# Altium footprint library UWRT Footprint Library.PcbLib: 258 footprints (part 15 of 17)
Each footprint in its own frame and in the unit in brackets; x right, y up, seen from the top. Pads: shape width x height; smd on the part's side, far side on the other; paste and mask are expansions set on the pad; w line width, h text height; cw(c..) or ccw(c..) is an arc to the next point about the centre after c.
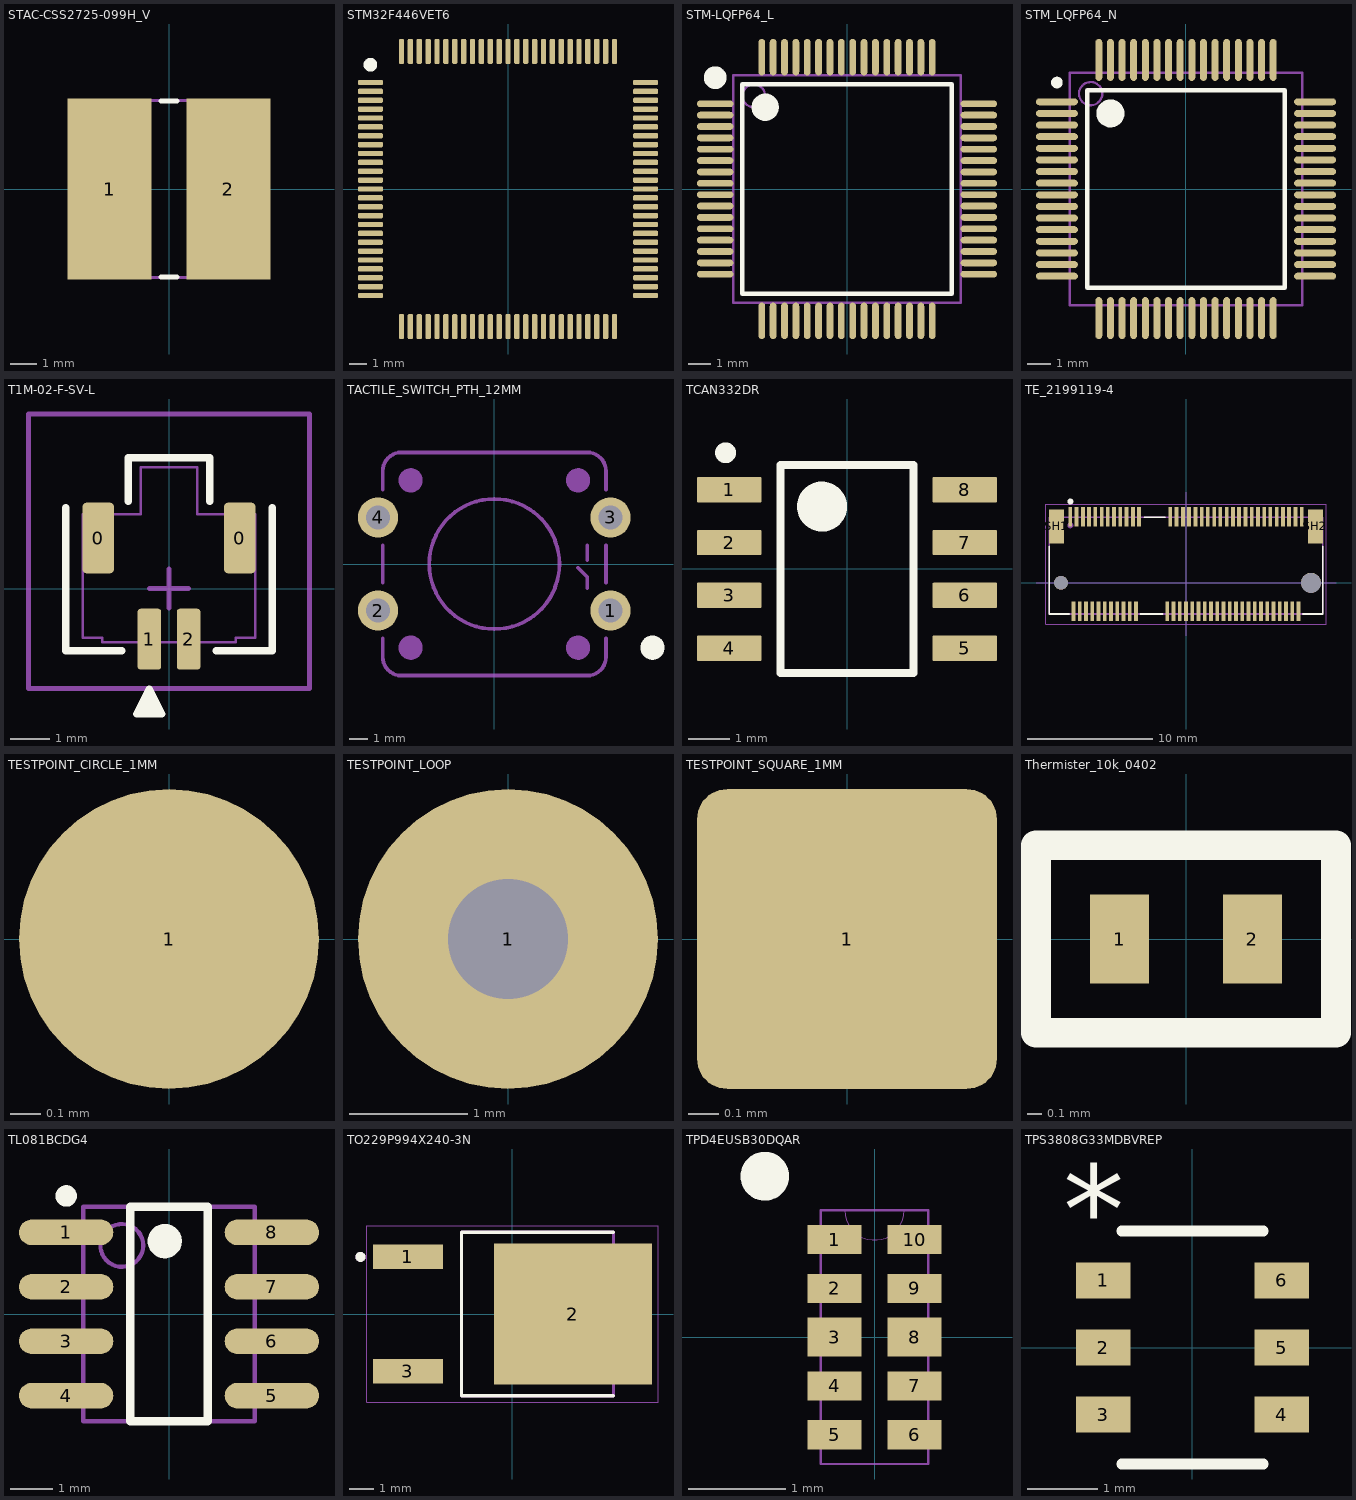
[diagram p14: the footprints below, top view; thin cyan lines are the x and y axes]

## STAC-CSS2725-099H_V [mm] "Chip Resistor, 2-Leads, Body 7.06x6.7mm"
height 1.24
pads (2):
  rect 3.18x6.86 smd: 1(-2.25,0) 2(2.25,0)
Top Overlay:
  lines w0.2: -0.3,-3.33 0.3,-3.33 ; -0.3,3.33 0.3,3.33
Mechanical 13:
  lines w0.1: -3.53,-3.35 3.53,-3.35 3.53,3.35 -3.53,3.35 -3.53,-3.35
3D body "RESC6865X12L.step": height 1.24, standoff 0, extent -3.53,-3.35 3.53,3.35

## STM32F446VET6 [mm] "LQFP100"
pads (100):
  rrect50% 1.4x0.3 smd mask+0.051: 1(-7.75,6) 2(-7.75,5.5) 3(-7.75,5) 4(-7.75,4.5) 5(-7.75,4) 6(-7.75,3.5) 7(-7.75,3) 8(-7.75,2.5) 9(-7.75,2) 10(-7.75,1.5) 11(-7.75,1) 12(-7.75,0.5) 13(-7.75,0) 14(-7.75,-0.5) 15(-7.75,-1) 16(-7.75,-1.5) 17(-7.75,-2) 18(-7.75,-2.5) 19(-7.75,-3) 20(-7.75,-3.5) 21(-7.75,-4) 22(-7.75,-4.5) 23(-7.75,-5) 24(-7.75,-5.5) 25(-7.75,-6) 51(7.75,-6) 52(7.75,-5.5) 53(7.75,-5) 54(7.75,-4.5) 55(7.75,-4) 56(7.75,-3.5) 57(7.75,-3) 58(7.75,-2.5) 59(7.75,-2) 60(7.75,-1.5) 61(7.75,-1) 62(7.75,-0.5) 63(7.75,0) 64(7.75,0.5) 65(7.75,1) 66(7.75,1.5) 67(7.75,2) 68(7.75,2.5) 69(7.75,3) 70(7.75,3.5) 71(7.75,4) 72(7.75,4.5) 73(7.75,5) 74(7.75,5.5) 75(7.75,6)
  rrect50% 0.3x1.4 smd mask+0.051: 26(-6,-7.75) 27(-5.5,-7.75) 28(-5,-7.75) 29(-4.5,-7.75) 30(-4,-7.75) 31(-3.5,-7.75) 32(-3,-7.75) 33(-2.5,-7.75) 34(-2,-7.75) 35(-1.5,-7.75) 36(-1,-7.75) 37(-0.5,-7.75) 38(0,-7.75) 39(0.5,-7.75) 40(1,-7.75) 41(1.5,-7.75) 42(2,-7.75) 43(2.5,-7.75) 44(3,-7.75) 45(3.5,-7.75) 46(4,-7.75) 47(4.5,-7.75) 48(5,-7.75) 49(5.5,-7.75) 50(6,-7.75) 76(6,7.75) 77(5.5,7.75) 78(5,7.75) 79(4.5,7.75) 80(4,7.75) 81(3.5,7.75) 82(3,7.75) 83(2.5,7.75) 84(2,7.75) 85(1.5,7.75) 86(1,7.75) 87(0.5,7.75) 88(0,7.75) 89(-0.5,7.75) 90(-1,7.75) 91(-1.5,7.75) 92(-2,7.75) 93(-2.5,7.75) 94(-3,7.75) 95(-3.5,7.75) 96(-4,7.75) 97(-4.5,7.75) 98(-5,7.75) 99(-5.5,7.75) 100(-6,7.75)
Top Overlay:
  circle w0.508: c-7.75,7 r0.127
3D body "User Library-LQFP100.STEP": height 1.6, standoff 0, extent -8,-8 8,8

## STM-LQFP64_L [mm] "QFP, 64-Leads, Body 10x10mm, Pitch 0.5mm, IPC High Density"
height 1.6
pads (64):
  oval 1.6x0.3 smd: 1(-5.8,3.75) 2(-5.8,3.25) 3(-5.8,2.75) 4(-5.8,2.25) 5(-5.8,1.75) 6(-5.8,1.25) 7(-5.8,0.75) 8(-5.8,0.25) 9(-5.8,-0.25) 10(-5.8,-0.75) 11(-5.8,-1.25) 12(-5.8,-1.75) 13(-5.8,-2.25) 14(-5.8,-2.75) 15(-5.8,-3.25) 16(-5.8,-3.75) 33(5.8,-3.75) 34(5.8,-3.25) 35(5.8,-2.75) 36(5.8,-2.25) 37(5.8,-1.75) 38(5.8,-1.25) 39(5.8,-0.75) 40(5.8,-0.25) 41(5.8,0.25) 42(5.8,0.75) 43(5.8,1.25) 44(5.8,1.75) 45(5.8,2.25) 46(5.8,2.75) 47(5.8,3.25) 48(5.8,3.75)
  oval 0.3x1.6 smd: 17(-3.75,-5.8) 18(-3.25,-5.8) 19(-2.75,-5.8) 20(-2.25,-5.8) 21(-1.75,-5.8) 22(-1.25,-5.8) 23(-0.75,-5.8) 24(-0.25,-5.8) 25(0.25,-5.8) 26(0.75,-5.8) 27(1.25,-5.8) 28(1.75,-5.8) 29(2.25,-5.8) 30(2.75,-5.8) 31(3.25,-5.8) 32(3.75,-5.8) 49(3.75,5.8) 50(3.25,5.8) 51(2.75,5.8) 52(2.25,5.8) 53(1.75,5.8) 54(1.25,5.8) 55(0.75,5.8) 56(0.25,5.8) 57(-0.25,5.8) 58(-0.75,5.8) 59(-1.25,5.8) 60(-1.75,5.8) 61(-2.25,5.8) 62(-2.75,5.8) 63(-3.25,5.8) 64(-3.75,5.8)
Top Overlay:
  circle w0.6: c-3.6,3.6 r0.3
  circle w0.75: c-5.8,4.9 r0.125
  lines w0.2: -4.6,-4.6 4.6,-4.6 4.6,4.6 -4.6,4.6 -4.6,-4.6
Mechanical 13:
  circle w0.1: c-4.1,4.1 r0.5
  lines w0.1: -5,-5 5,-5 5,5 -5,5 -5,-5
3D body "LQFP64.step": height 1.56, standoff 0, extent -5.979,-6 6.021,6

## STM_LQFP64_N [mm] "Thin QFP, 64-Leads, Body 10x10mm, Pitch 0.5mm, IPC Medium Density"
height 1.6
pads (64):
  oval 1.8x0.3 smd mask+0.05: 1(-5.55,3.75) 2(-5.55,3.25) 3(-5.55,2.75) 4(-5.55,2.25) 5(-5.55,1.75) 6(-5.55,1.25) 7(-5.55,0.75) 8(-5.55,0.25) 9(-5.55,-0.25) 10(-5.55,-0.75) 11(-5.55,-1.25) 12(-5.55,-1.75) 13(-5.55,-2.25) 14(-5.55,-2.75) 15(-5.55,-3.25) 16(-5.55,-3.75) 33(5.55,-3.75) 34(5.55,-3.25) 35(5.55,-2.75) 36(5.55,-2.25) 37(5.55,-1.75) 38(5.55,-1.25) 39(5.55,-0.75) 40(5.55,-0.25) 41(5.55,0.25) 42(5.55,0.75) 43(5.55,1.25) 44(5.55,1.75) 45(5.55,2.25) 46(5.55,2.75) 47(5.55,3.25) 48(5.55,3.75)
  oval 0.3x1.8 smd mask+0.05: 17(-3.75,-5.55) 18(-3.25,-5.55) 19(-2.75,-5.55) 20(-2.25,-5.55) 21(-1.75,-5.55) 22(-1.25,-5.55) 23(-0.75,-5.55) 24(-0.25,-5.55) 25(0.25,-5.55) 26(0.75,-5.55) 27(1.25,-5.55) 28(1.75,-5.55) 29(2.25,-5.55) 30(2.75,-5.55) 31(3.25,-5.55) 32(3.75,-5.55) 49(3.75,5.55) 50(3.25,5.55) 51(2.75,5.55) 52(2.25,5.55) 53(1.75,5.55) 54(1.25,5.55) 55(0.75,5.55) 56(0.25,5.55) 57(-0.25,5.55) 58(-0.75,5.55) 59(-1.25,5.55) 60(-1.75,5.55) 61(-2.25,5.55) 62(-2.75,5.55) 63(-3.25,5.55) 64(-3.75,5.55)
Top Overlay:
  circle w0.6: c-3.25,3.25 r0.3
  circle w0.25: c-5.55,4.577 r0.125
  lines w0.2: -4.25,-4.25 4.25,-4.25 4.25,4.25 -4.25,4.25 -4.25,-4.25
Mechanical 13:
  circle w0.1: c-4.1,4.1 r0.5
  lines w0.1: -5,-5 5,-5 5,5 -5,5 -5,-5
3D body "LQFP64.step": height 1.56, standoff 0, extent -6,-5.99 6,6.01

## T1M-02-F-SV-L [mm]
pads (4):
  rrect25% 0.8x1.8 smd: 0(-1.8,1.288) 0(1.8,1.288)
  rrect25% 0.6x1.55 smd: 1(-0.5,-1.287) 2(0.5,-1.287)
Top Overlay:
  region: -0.5,-2.557 -0.818,-3.192 -0.183,-3.192
  lines w0.191: -2.628,2.064 -2.628,-1.587 -1.199,-1.587 ; -1.04,2.222 -1.04,3.334 1.04,3.334 1.04,2.222 ; 1.199,-1.587 2.627,-1.587 2.627,2.064 ; -0.818,-3.192 -0.183,-3.192 -0.5,-2.557 -0.818,-3.192
Mechanical 1:
  lines w0.064: -2.2,-1.252 -1.7,-1.252 -1.7,-1.362 1.7,-1.362 1.7,-1.252 2.2,-1.252 2.2,1.887 0.722,1.887 0.722,3.088 -0.723,3.088 -0.723,1.887 -2.2,1.887 -2.2,-1.252
Mechanical 15:
  lines w0.127: -0.5,0 0.5,0 ; 0,-0.5 0,0.5 ; -3.58,-2.54 -3.58,4.445 3.58,4.445 3.58,-2.54 -3.58,-2.54
3D body "T1M-02-F-SV-L.stp": height 5.51, standoff 0.01, extent -2.2,-1.862 2.2,3.088

## TACTILE_SWITCH_PTH_12MM [mil]
pads (4):
  round 85 / inner round 60 / far side round 85 hole 51.18: 1(246.06,-98.43) 2(-246.06,-98.43) 3(246.06,98.43) 4(-246.06,98.43)
Top Overlay:
  circle w27.56: c334.65,-177.17 r11.81
Mechanical 3:
  lines w8: 177.17,-7.87 196.85,-27.56 196.85,-51.18 ; 196.85,7.87 196.85,39.37
Mechanical 7:
  circle w8: c0,0 r137.8
  circle w27.56: c-177.17,177.17 r11.81
  circle w27.56: c177.17,177.17 r11.81
  circle w27.56: c177.17,-177.17 r11.81
  circle w27.56: c-177.17,-177.17 r11.81
  lines w8: -236.22,-157.48 -236.22,-196.85 ccw(c-196.85,-196.85) -196.85,-236.22 196.85,-236.22 ccw(c196.85,-196.85) 236.22,-196.85 236.22,-157.48 ; -236.22,-39.37 -236.22,39.37 ; -236.22,157.48 -236.22,196.85 cw(c-196.85,196.85) -196.85,236.22 196.85,236.22 cw(c196.85,196.85) 236.22,196.85 236.22,157.48 ; 236.22,-39.37 236.22,39.37
3D body "User Library-SWT9.step": height 374.02, standoff -137.8, extent -274.07,-235.23 272.11,237.21

## TCAN332DR [mil] "SOIC, 8 Leads, Body 5x4mm, Pitch 1.27mm"
height 68.9
pads (8):
  rrect8% 61x24 smd: 1(-111.5,75) 2(-111.5,25) 3(-111.5,-25) 4(-111.5,-75) 5(111.5,-75) 6(111.5,-25) 7(111.5,25) 8(111.5,75)
Top Overlay:
  circle w23.62: c-23.62,59.06 r11.81
  circle w9.84: c-115,110 r4.92
  lines w7.87: -62.99,-98.43 62.99,-98.43 62.99,98.43 -62.99,98.43 -62.99,-98.43
3D body "TCAN332DR.stp": height 68.9, standoff 0, extent -118.1,-96.45 118.12,96.46

## TE_2199119-4 [mm]
pads (71):
  rect 0.3x1.55 smd: 1(-9.25,5.275) 2(-9,-2.275) 3(-8.75,5.275) 4(-8.5,-2.275) 5(-8.25,5.275) 6(-8,-2.275) 7(-7.75,5.275) 8(-7.5,-2.275) 9(-7.25,5.275) 10(-7,-2.275) 11(-6.75,5.275) 12(-6.5,-2.275) 13(-6.25,5.275) 14(-6,-2.275) 15(-5.75,5.275) 16(-5.5,-2.275) 17(-5.25,5.275) 18(-5,-2.275) 19(-4.75,5.275) 20(-4.5,-2.275) 21(-4.25,5.275) 22(-4,-2.275) 23(-3.75,5.275) 32(-1.5,-2.275) 33(-1.25,5.275) 34(-1,-2.275) 35(-0.75,5.275) 36(-0.5,-2.275) 37(-0.25,5.275) 38(0,-2.275) 39(0.25,5.275) 40(0.5,-2.275) 41(0.75,5.275) 42(1,-2.275) 43(1.25,5.275) 44(1.5,-2.275) 45(1.75,5.275) 46(2,-2.275) 47(2.25,5.275) 48(2.5,-2.275) 49(2.75,5.275) 50(3,-2.275) 51(3.25,5.275) 52(3.5,-2.275) 53(3.75,5.275) 54(4,-2.275) 55(4.25,5.275) 56(4.5,-2.275) 57(4.75,5.275) 58(5,-2.275) 59(5.25,5.275) 60(5.5,-2.275) 61(5.75,5.275) 62(6,-2.275) 63(6.25,5.275) 64(6.5,-2.275) 65(6.75,5.275) 66(7,-2.275) 67(7.25,5.275) 68(7.5,-2.275) 69(7.75,5.275) 70(8,-2.275) 71(8.25,5.275) 72(8.5,-2.275) 73(8.75,5.275) 74(9,-2.275) 75(9.25,5.275)
  rect 1.2x2.75 smd: SH1(-10.35,4.5) SH2(10.35,4.5)
  round 1.1 hole 1.1 unplated: ""(-10,0)
  round 1.6 hole 1.6 unplated: ""(10,0)
Top Overlay:
  circle w0.24: c-9.25,6.5 r0.12
  lines w0.127: -10.95,2.9 -10.95,-2.5 -9.35,-2.5 ; -3.65,-2.5 -1.85,-2.5 ; -3.35,5.25 -1.65,5.25 ; 9.35,-2.5 10.95,-2.5 10.95,2.9
Mechanical 13:
  circle w0.24: c-9.25,4.595 r0.12
  lines w0.05: -12,0 12,0 ; 0,-4.25 0,7.25
  lines w0.127: -10.95,-2.5 -10.95,5.25 10.95,5.25 10.95,-2.5 -10.95,-2.5
Mechanical 15:
  lines w0.05: -11.2,-3.3 -11.2,6.3 11.2,6.3 11.2,-3.3 -11.2,-3.3

## TESTPOINT_CIRCLE_1MM [mm]
pads (1):
  round 1 smd: 1(0,0)

## TESTPOINT_LOOP [mm]
pads (1):
  round 2.54 hole 1.02: 1(0,0)
3D body "User Library-Test Point Keystone - 5002 WHITE.STEP": height 4.57, standoff -3.05, extent -1.27,-1.27 1.27,1.27

## TESTPOINT_SQUARE_1MM [mm]
pads (1):
  rrect20% 1x1 smd: 1(0,0)

## Thermister_10k_0402 [mm]
pads (2):
  rect 0.4x0.6 smd: 1(-0.45,0) 2(0.45,0)
Top Overlay:
  lines w0.2: -1.016,-0.635 1.016,-0.635 1.016,0.635 -1.016,0.635 -1.016,-0.635
3D body "User Library-d0402h025.step": height 0.25, standoff 0, extent -0.5,-0.25 0.5,0.25

## TL081BCDG4 [mm] "IC OPAMP JFET 1 CIRCUIT 8SOIC"
pads (8):
  oval 2.2x0.6 smd: 1(-2.4,1.905) 2(-2.4,0.635) 3(-2.4,-0.635) 4(-2.4,-1.905) 5(2.4,-1.905) 6(2.4,-0.635) 7(2.4,0.635) 8(2.4,1.905)
Top Overlay:
  circle w0.25: c-2.4,2.755 r0.125
  circle w0.4: c-0.1,1.7 r0.2
  lines w0.2: -0.9,-2.5 -0.9,2.5 0.9,2.5 0.9,-2.5 -0.9,-2.5
Mechanical 13:
  circle w0.1: c-1.1,1.6 r0.5
  lines w0.1: -2,-2.5 -2,2.5 2,2.5 2,-2.5 -2,-2.5
3D body: height 1.75, standoff 0.1, extent -2,-2.5 2,2.5

## TO229P994X240-3N [mm]
pads (3):
  rect 2.81x0.98 smd: 1(-4.19,2.29) 3(-4.19,-2.29)
  rect 6.33x5.67 smd: 2(2.43,0)
Top Overlay:
  circle w0.2: c-6.095,2.29 r0.1
  lines w0.127: 4.055,-3.283 -2.045,-3.283 -2.045,3.283 4.055,3.283
Top Paste:
  region: 3.775,-1.235 5.305,-1.235 5.305,-2.545 3.775,-2.545
  region: 1.665,-1.235 3.195,-1.235 3.195,-2.545 1.665,-2.545
  region: -0.445,-1.235 1.085,-1.235 1.085,-2.545 -0.445,-2.545
  region: 3.775,2.545 5.305,2.545 5.305,1.235 3.775,1.235
  region: 1.665,2.545 3.195,2.545 3.195,1.235 1.665,1.235
  region: -0.445,2.545 1.085,2.545 1.085,1.235 -0.445,1.235
  region: 3.775,0.655 5.305,0.655 5.305,-0.655 3.775,-0.655
  region: -0.445,0.655 1.085,0.655 1.085,-0.655 -0.445,-0.655
  region: 1.665,0.655 3.195,0.655 3.195,-0.655 1.665,-0.655
Mechanical 4:
  circle w0.2: c-6.095,2.29 r0.1
  circle w0.2: c-6.095,2.29 r0.1
  lines w0.127: -2.045,-3.283 -2.045,3.283 ; -2.045,-3.283 4.055,-3.283 ; -2.045,-3.283 -2.045,3.283 ; -2.045,-3.283 4.055,-3.283 ; -2.045,3.283 4.055,3.283 ; -2.045,3.283 4.055,3.283 ; 4.055,-3.283 4.055,3.283 ; 4.055,-3.283 4.055,3.283
Mechanical 16:
  lines w0.05: -5.845,-3.532 5.845,-3.532 5.845,3.532 -5.845,3.532 -5.845,-3.532
3D body "CircuitWorks-TO-252.STEP": height 2.3, standoff 0, extent -4.748,-3.303 4.952,3.277

## TPD4EUSB30DQAR [mm] "USON-10"
height 0.55
pads (10):
  rect 0.55x0.3 smd paste-0.15 mask+0.05: 1(-0.41,1) 2(-0.41,0.5) 4(-0.41,-0.5) 5(-0.41,-1) 6(0.41,-1) 7(0.41,-0.5) 9(0.41,0.5) 10(0.41,1)
  rect 0.55x0.4 smd paste+0 mask+0.05: 3(-0.41,0) 8(0.41,0)
Top Overlay:
  circle w0.25: c-1.125,1.65 r0.125
Mechanical 13:
  lines w0: -0.305,1.3 ccw(c0,1.3) 0.305,1.3
  lines w0.025: -0.55,-1.3 -0.55,1.3 0.55,1.3 0.55,-1.3 -0.55,-1.3
3D body "DQA10.step": height 0.55, standoff 0, extent -0.55,-1.3 0.55,1.3
3D body: height 0.25, standoff 0, extent 0,0 0.254,0.254

## TPS3808G33MDBVREP [mil]
pads (6):
  rect 30.5x20 smd paste+0 mask+0: 1(-49.75,37.4) 2(-49.75,0) 3(-49.75,-37.4) 4(49.75,-37.4) 5(49.75,0) 6(49.75,37.4)
Top Overlay:
  lines w6: -39.5,-65 39.5,-65 ; -39.5,65 39.5,65
  text "*" at -72.25,52.4 h50
3D body "DBV6.step": height 57.09, standoff 0, extent -59.01,-59.99 59.02,60.01